# Altium footprint library wilamp_st_v1p00.PcbLib: 52 footprints (part 3 of 4)
Each footprint in its own frame and in the unit in brackets; x right, y up, seen from the top. Pads: shape width x height; smd on the part's side, far side on the other; paste and mask are expansions set on the pad; w line width, h text height; cw(c..) or ccw(c..) is an arc to the next point about the centre after c.
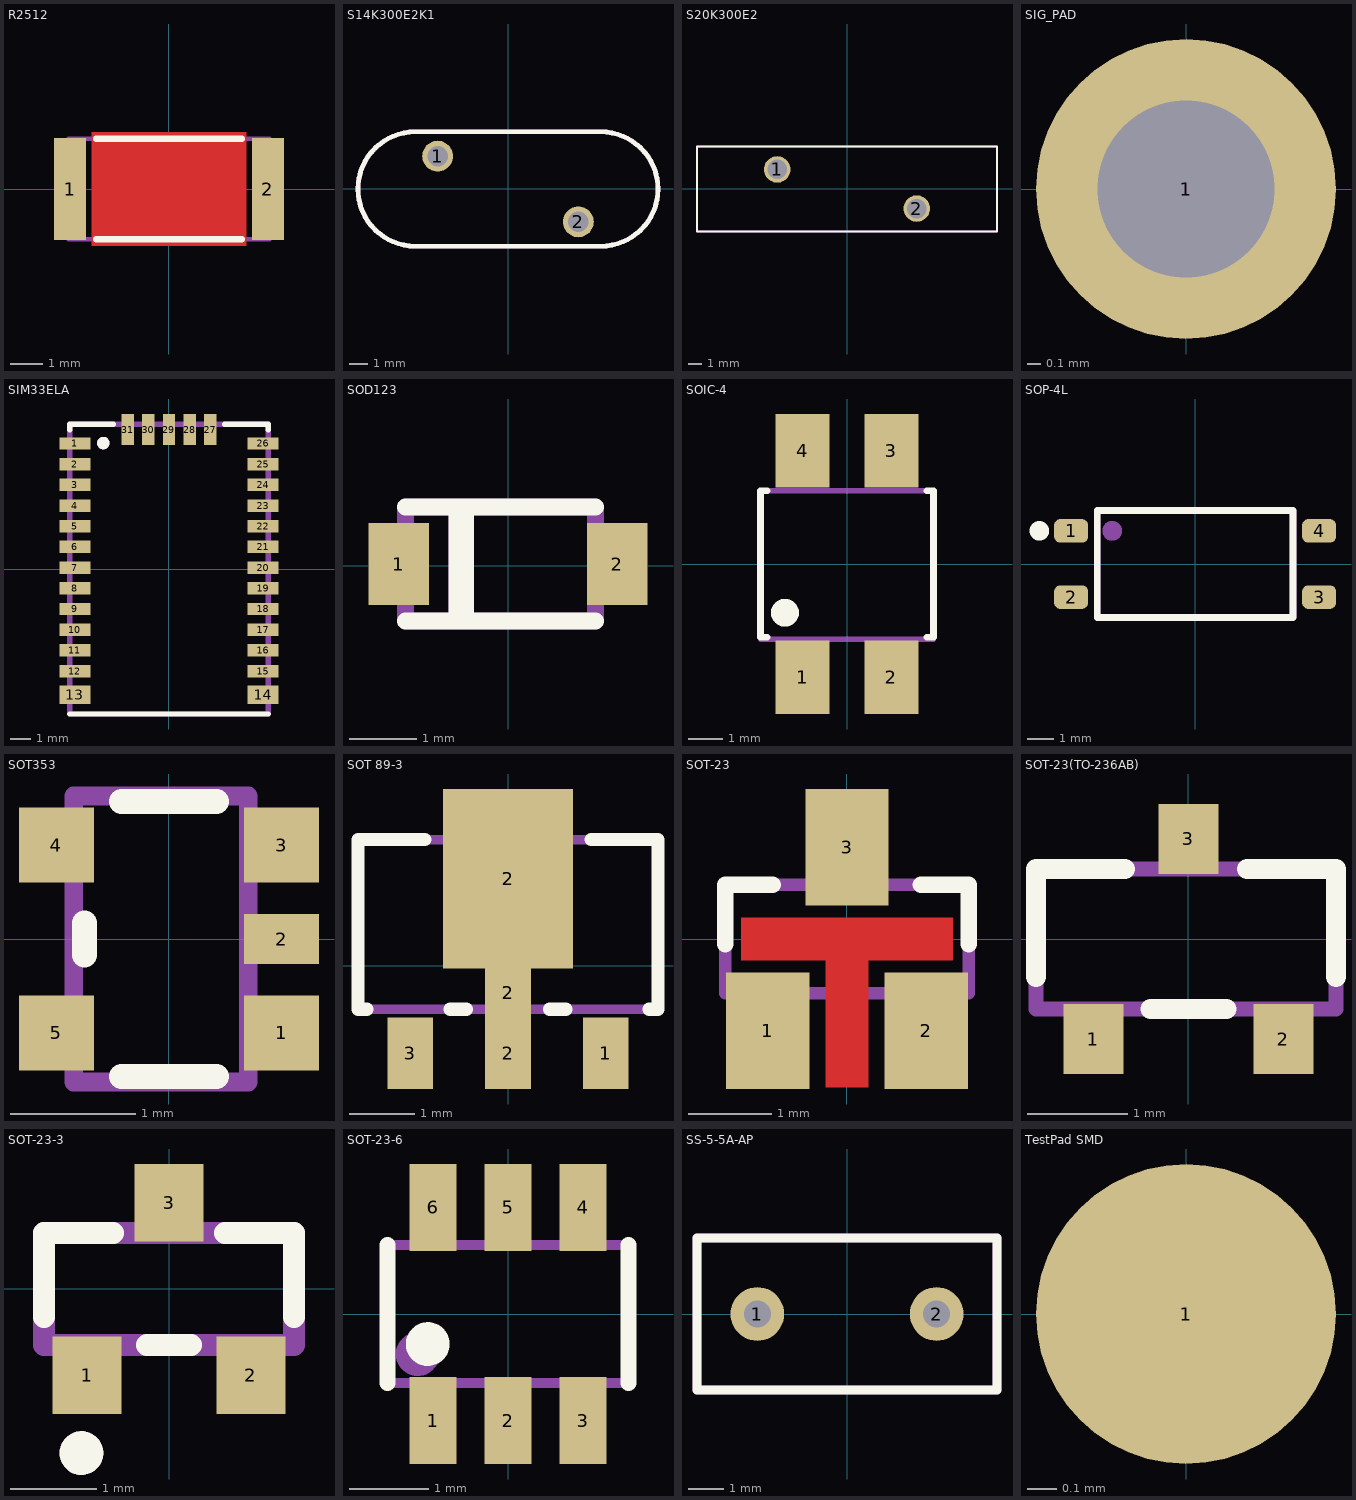
[diagram p2: the footprints below, top view; thin cyan lines are the x and y axes]

## R2512 [mm]
pads (2):
  rect 1x3.2 smd: 1(-3.1,0) 2(3.1,0)
Top Layer:
  pour cut-out: -2.413,1.778 2.413,1.778 2.413,-1.778 -2.413,-1.778
Top Overlay:
  lines w0.2: -2.286,-1.575 2.286,-1.575 ; -2.286,1.575 2.286,1.575
Mechanical 16:
  lines w0.15: -3.15,-1.575 -3.15,1.575 ; -3.15,-1.575 3.15,-1.575 ; -3.15,-1.575 3.15,-1.575 ; -3.15,-1.575 -3.15,1.575 ; -3.15,1.575 3.15,1.575 ; -3.15,1.575 3.15,1.575 ; 3.15,-1.575 3.15,1.575 ; 3.15,-1.575 3.15,1.575
Mechanical 29:
  text ".Designator" at 0.054,0.754 h0.6
3D body "User Library-2512 SMD Resistor.step": height 1.6, standoff 0, extent -3.175,-1.5 3.175,1.5

## S14K300E2K1 [mm]
pads (2):
  round 1.65 hole 1.1: 1(-3.75,1.75) 2(3.75,-1.75)
Top Overlay:
  lines w0.254: -4.95,-3.05 cw(c-4.95,0) -4.95,3.05 4.95,3.05 cw(c4.95,0) 4.95,-3.05 -4.95,-3.05
Mechanical 16:
  lines w0.254: -4.95,-3.05 cw(c-4.95,0) -4.95,3.05 4.95,3.05 cw(c4.95,0) 4.95,-3.05 -4.95,-3.05
Mechanical 29:
  text ".Designator" at 1.651,0.381 h1.5
3D body: height 20, standoff 0, extent -7.979,-3.044 -1.903,3.044
3D body: height 20, standoff 0, extent 1.915,-3.04 7.991,3.048
3D body: height 20, standoff 0, extent -4.95,-3.05 4.95,3.05

## S20K300E2 [mm]
pads (2):
  round 1.9 hole 1.4: 1(-5,1.4) 2(5,-1.4)
Top Overlay:
  lines w0.127: -10.75,-3.05 10.75,-3.05 10.75,3.05 -10.75,3.05 -10.75,-3.05
Mechanical 16:
  lines w0.127: -10.75,-3.05 -10.75,3.05 10.75,3.05 10.75,-3.05 -10.75,-3.05
Mechanical 29:
  text ".Designator" at -1.549,-0.33 h1
3D body: height 25.5, standoff 0, extent -10.75,-3.05 10.75,3.05

## SIG_PAD [mm]
pads (1):
  round 2.2 hole 1.3: 1(0,0)

## SIM33ELA [mm]
pads (31):
  rect 1.5x0.6 smd: 1(-4.55,6.075) 2(-4.55,5.075) 3(-4.55,4.075) 4(-4.55,3.075) 5(-4.55,2.075) 6(-4.55,1.075) 7(-4.55,0.075) 8(-4.55,-0.925) 9(-4.55,-1.925) 10(-4.55,-2.925) 11(-4.55,-3.925) 12(-4.55,-4.925) 15(4.55,-4.925) 16(4.55,-3.925) 17(4.55,-2.925) 18(4.55,-1.925) 19(4.55,-0.925) 20(4.55,0.075) 21(4.55,1.075) 22(4.55,2.075) 23(4.55,3.075) 24(4.55,4.075) 25(4.55,5.075) 26(4.55,6.075)
  rect 1.5x0.9 smd: 13(-4.55,-6.075) 14(4.55,-6.075)
  rect 0.6x1.5 smd: 27(2,6.75) 28(1,6.75) 29(0,6.75) 30(-1,6.75) 31(-2,6.75)
Top Overlay:
  circle w0.35: c-3.175,6.096 r0.127
  lines w0.254: -4.8,-7 4.8,-7 ; -4.8,6.731 -4.8,7 -2.682,7 ; 2.682,7 4.8,7 4.8,6.731
Mechanical 16:
  circle w0.35: c-3.175,6.096 r0.127
  lines w0.254: -4.8,-7 -4.8,7 4.8,7 4.8,-7 -4.8,-7
Mechanical 29:
  text ".Designator" at 1.499,-4.064 h3
3D body "User Library-SIM33ELA.step": height 2.25, standoff -0.03, extent -4.8,-7.102 4.8,6.873

## SOD123 [mm]
pads (2):
  rect 0.91x1.22 smd: 1(-1.635,0.028) 2(1.635,0.028)
Top Overlay:
  rectangle: -0.889,-0.822 -0.508,0.878
  lines w0.254: -1.537,-0.822 1.313,-0.822 ; -1.537,0.878 1.313,0.878
Mechanical 16:
  rectangle: -0.889,-0.822 -0.508,0.878
  lines w0.254: -1.537,-0.822 1.313,-0.822 1.313,0.878 -1.537,0.878 -1.537,-0.822
Mechanical 29:
  text ".Designator" at 1.227,0.32 h0.46
3D body "User Library-SOD3716X14.STEP": height 1.35, standoff 0, extent -1.85,-0.775 1.85,0.775

## SOIC-4 [mm]
pads (4):
  rect 1.55x2.1 smd: 1(-1.27,-3.25) 2(1.27,-3.25) 3(1.27,3.25) 4(-1.27,3.25)
Top Overlay:
  circle w0.4: c-1.778,-1.397 r0.2
  lines w0.2: -2.286,-2.1 -2.475,-2.1 -2.475,2.1 -2.286,2.1 ; 2.286,-2.1 2.475,-2.1 2.475,2.1 2.286,2.1
Mechanical 16:
  lines w0.15: -2.475,-2.159 -2.475,2.1 ; -2.475,-2.159 2.475,-2.159 ; -2.475,-2.159 -2.475,2.1 ; -2.475,-2.159 2.475,-2.159 ; -2.475,2.1 2.475,2.1 ; -2.475,2.1 2.475,2.1 ; 2.475,-2.159 2.475,2.1 ; 2.475,-2.159 2.475,2.1
Mechanical 29:
  text ".Designator" at 0.556,0.073 h0.6
3D body: height 2.9, standoff 0, extent -2.475,-2.1 2.475,2.1

## SOP-4L [mm]
pads (4):
  rrect50% 1.3x0.9 smd: 1(-4.75,1.27) 2(-4.75,-1.27) 3(4.75,-1.27) 4(4.75,1.27)
Top Overlay:
  circle w0.5: c-5.969,1.27 r0.127
  lines w0.254: -3.75,-2.05 3.75,-2.05 3.75,2.05 -3.75,2.05 -3.75,-2.05
Mechanical 16:
  circle w0.5: c-3.175,1.27 r0.127
  lines w0.254: -3.75,-2.05 3.75,-2.05 3.75,2.05 -3.75,2.05 -3.75,-2.05
Mechanical 29:
  text ".Designator" at -1.06,-0.92 h2
3D body: height 2, standoff 0, extent -3.75,-2.05 3.75,2.05

## SOT353 [mm]
pads (5):
  rect 0.6x0.6 smd: 1(0.9,-0.75) 3(0.9,0.75) 4(-0.9,0.75) 5(-0.9,-0.75)
  rect 0.6x0.4 smd: 2(0.9,0)
Top Overlay:
  lines w0.2: -0.675,-0.127 -0.675,0.127 ; -0.381,-1.1 0.381,-1.1 ; -0.381,1.1 0.381,1.1
Mechanical 16:
  lines w0.15: -0.762,-1.143 0.635,-1.143 ; -0.762,-1.143 -0.762,1.143 ; -0.762,-1.143 0.635,-1.143 ; -0.762,-1.143 -0.762,1.143 ; -0.762,1.143 0.635,1.143 ; -0.762,1.143 0.635,1.143 ; 0.635,-1.143 0.635,1.143 ; 0.635,-1.143 0.635,1.143
Mechanical 29:
  text ".Designator" at 0.279,-0.508 h0.6
3D body "User Library-sot353.step": height 1, standoff 0, extent -1.15,-1.05 1.15,1.05

## SOT 89-3 [mm]
pads (5):
  rect 0.7x1.1 smd: 1(1.5,-1.338) 2(0,-1.338) 3(-1.5,-1.338)
  rect 0.7x0.75 smd: 2(0,-0.413)
  rect 2x2.75 smd: 2(0,1.338)
Top Overlay:
  lines w0.2: -2.159,-0.665 -2.3,-0.665 -2.3,1.935 -1.27,1.935 ; -0.889,-0.665 -0.635,-0.665 ; 0.635,-0.665 0.889,-0.665 ; 1.27,1.935 2.3,1.935 2.3,-0.665 2.159,-0.665
Mechanical 16:
  lines w0.15: -2.3,-0.665 -2.3,1.935 ; -2.3,-0.665 2.3,-0.665 ; -2.3,-0.665 -2.3,1.935 ; -2.3,-0.665 2.3,-0.665 ; -2.3,1.935 2.3,1.935 ; -2.3,1.935 2.3,1.935 ; 2.3,-0.665 2.3,1.935 ; 2.3,-0.665 2.3,1.935
Mechanical 29:
  text ".Designator" at -0.15,0.409 h0.6
3D body "User Library-SOT89-3.STEP": height 1.54, standoff 0, extent -2.25,-1.682 2.25,2.568

## SOT-23 [mm]
pads (3):
  rect 1x1.4 smd: 1(-0.95,-1.1) 2(0.95,-1.1) 3(0,1.1)
Top Layer:
  pour cut-out: -0.254,-0.254 -0.254,-1.778 0.254,-1.778 0.254,-0.254
  pour cut-out: -1.27,0.254 -1.27,-0.254 1.27,-0.254 1.27,0.254
Top Overlay:
  lines w0.2: -1.46,-0.063 -1.46,0.65 -0.889,0.65 ; 0.889,0.65 1.46,0.65 1.46,-0.063
Mechanical 16:
  lines w0.15: -1.46,-0.65 1.46,-0.65 ; -1.46,-0.65 -1.46,0.65 ; -1.46,-0.65 1.46,-0.65 ; -1.46,-0.65 -1.46,0.65 ; -1.46,0.65 1.46,0.65 ; -1.46,0.65 1.46,0.65 ; 1.46,-0.65 1.46,0.65 ; 1.46,-0.65 1.46,0.65
Mechanical 29:
  text ".Designator" at 0.516,0.282 h0.6
3D body "User Library-SOT-23.step": height 0.98, standoff -0.01, extent -1.448,-1.21 1.448,1.21

## SOT-23(TO-236AB) [mm]
pads (3):
  rect 0.6x0.7 smd: 1(-0.95,-1) 2(0.95,-1) 3(0,1)
Top Overlay:
  lines w0.2: -1.524,-0.381 -1.524,0.7 -0.635,0.7 ; -0.381,-0.7 0.381,-0.7 ; 0.587,0.7 1.476,0.7 1.476,-0.381
Mechanical 16:
  lines w0.15: -1.524,-0.7 -1.524,0.7 ; -1.524,-0.7 1.476,-0.7 ; -1.524,-0.7 -1.524,0.7 ; -1.524,-0.7 1.476,-0.7 ; -1.524,0.7 1.476,0.7 ; -1.524,0.7 1.476,0.7 ; 1.476,-0.7 1.476,0.7 ; 1.476,-0.7 1.476,0.7
Mechanical 29:
  text ".Designator" at 0.398,0.264 h0.6
3D body "User Library-SOT-23.step": height 0.98, standoff -0.01, extent -1.448,-1.21 1.448,1.21

## SOT-23-3 [mm]
pads (3):
  rect 0.8x0.9 smd: 1(-0.95,-1) 2(0.95,-1) 3(0,1)
Top Overlay:
  circle w0.254: c-1.016,-1.905 r0.127
  lines w0.254: -1.45,-0.328 -1.45,0.65 -0.65,0.65 ; -0.254,-0.65 0.254,-0.65 ; 0.65,0.65 1.45,0.65 1.45,-0.328
Mechanical 16:
  circle w0.254: c-1.016,-1.905 r0.127
  lines w0.254: -1.45,-0.65 -1.45,0.65 1.45,0.65 1.45,-0.65 -1.45,-0.65
Mechanical 29:
  text ".Designator" at 0.607,0.318 h0.81
3D body "User Library-3-lead sot23-3.step": height 1.01, standoff -0.01, extent -1.46,-1.25 1.46,1.226

## SOT-23-6 [mm]
pads (6):
  rect 0.6x1.1 smd: 1(-0.95,-1.35) 2(0,-1.35) 3(0.95,-1.35) 4(0.95,1.35) 5(0,1.35) 6(-0.95,1.35)
Top Overlay:
  circle w0.3: c-1.016,-0.381 r0.127
  lines w0.2: -1.525,-0.875 -1.525,0.875 ; 1.525,-0.875 1.525,0.875
Mechanical 16:
  circle w0.3: c-1.143,-0.508 r0.127
  lines w0.127: -1.525,-0.875 -1.525,0.875 ; -1.525,-0.875 1.525,-0.875 ; -1.525,-0.875 -1.525,0.875 ; -1.525,-0.875 1.525,-0.875 ; -1.525,0.875 1.525,0.875 ; -1.525,0.875 1.525,0.875 ; 1.525,-0.875 1.525,0.875 ; 1.525,-0.875 1.525,0.875
Mechanical 29:
  text ".Designator" at 0.556,0.257 h0.6
3D body "User Library-SOT-23-6-4.STEP": height 1.45, standoff 0, extent -1.55,-1.535 1.55,1.535

## SS-5-5A-AP [mil]
pads (2):
  round 60 hole 30: 1(-100,0) 2(100,0)
Top Overlay:
  lines w10: -167.32,-84.65 167.32,-84.65 167.32,84.65 -167.32,84.65 -167.32,-84.65
Mechanical 16:
  lines w10: -167.32,-84.65 167.32,-84.65 167.32,84.65 -167.32,84.65 -167.32,-84.65
Mechanical 29:
  text ".Designator" at -100,-40 h78.74
3D body: height 309.06, standoff 0, extent -167.32,-84.65 167.32,84.65

## TestPad SMD [mil]
pads (1):
  round 40 smd: 1(0,0)